# Altium footprint library LimeMicroAltiumLib.PcbLib: 769 footprints (part 49 of 50)
Each footprint in its own frame and in the unit in brackets; x right, y up, seen from the top. Pads: shape width x height; smd on the part's side, far side on the other; paste and mask are expansions set on the pad; w line width, h text height; cw(c..) or ccw(c..) is an arc to the next point about the centre after c.
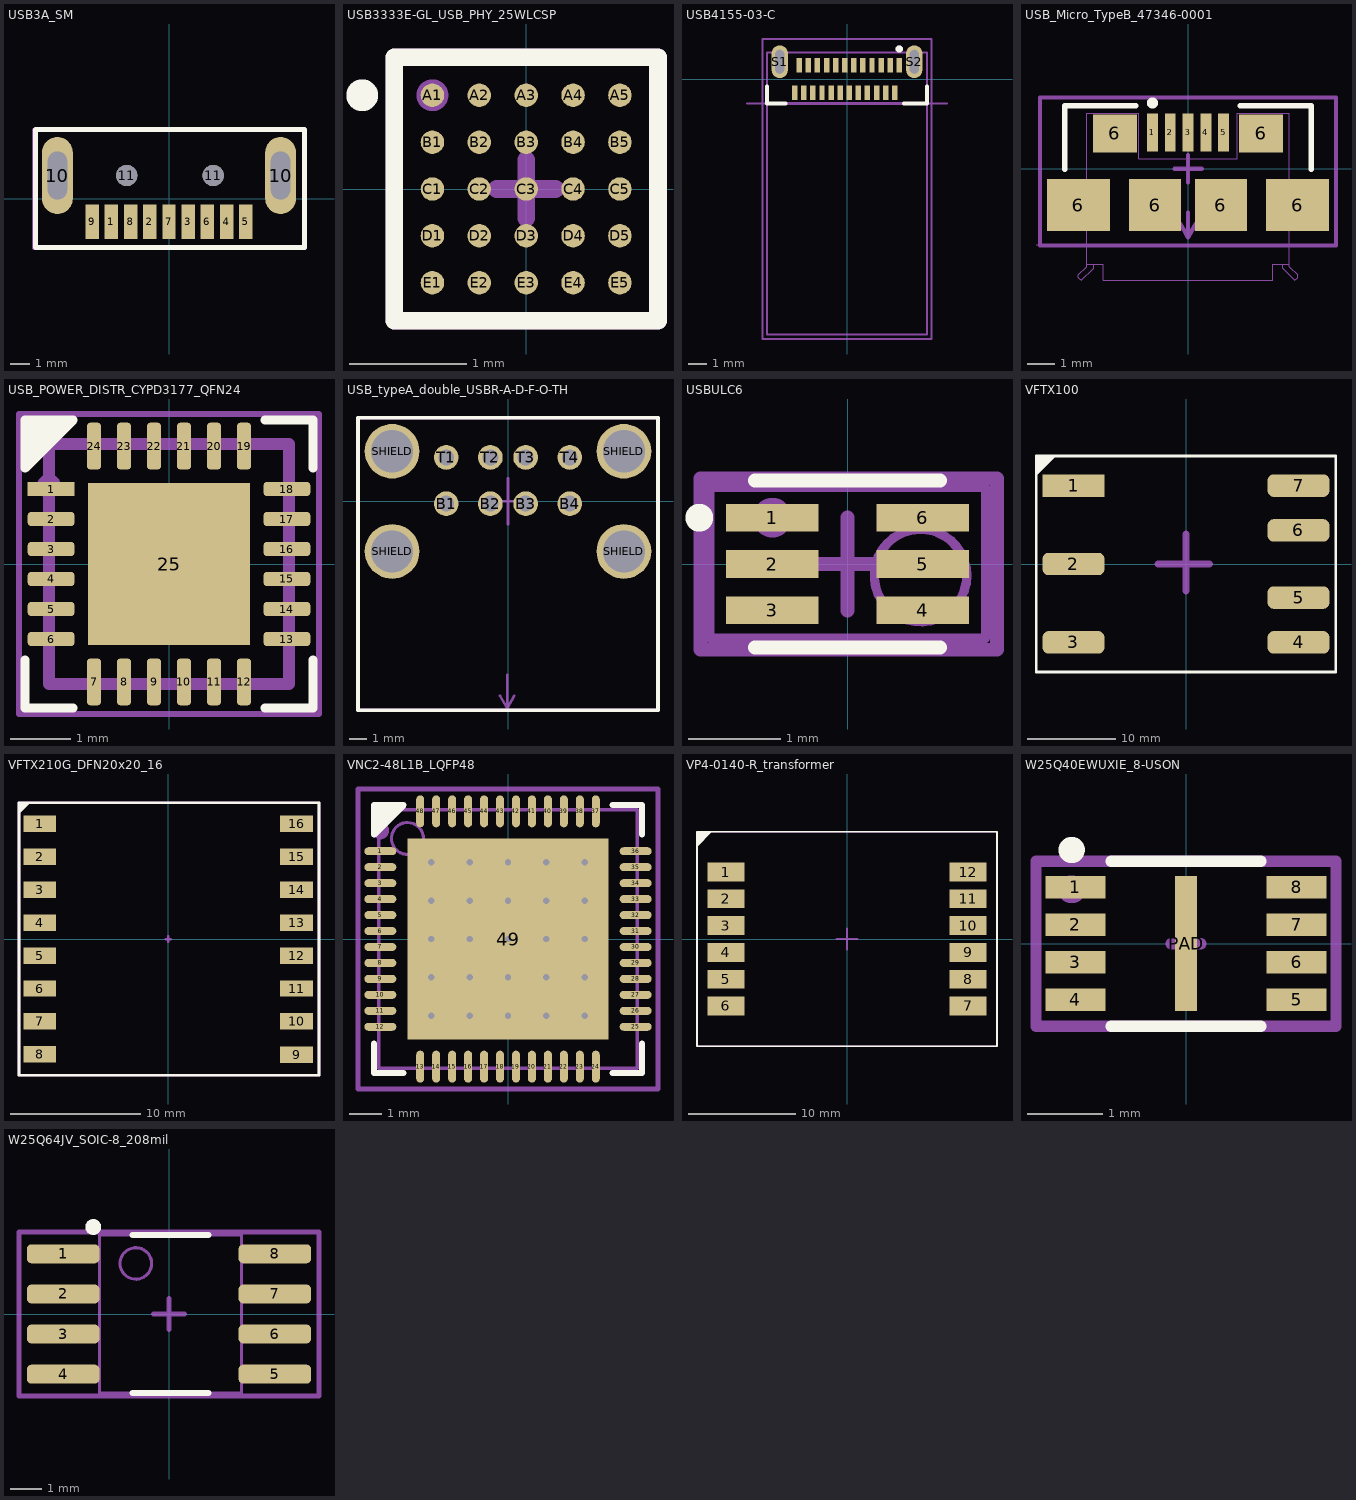
[diagram p48: the footprints below, top view; thin cyan lines are the x and y axes]

## USB3A_SM [mm]
pads (13):
  rect 0.7x1.8 smd: 1(-3,-1.2) 2(-1,-1.2) 3(1,-1.2) 4(3,-1.2) 5(4,-1.2) 6(2,-1.2) 7(0,-1.2) 8(-2,-1.2) 9(-4,-1.2)
  oval 1.6x4 hole 1 slot 2.5 at 90 deg: 10(-5.8,1.2) 10(5.8,1.2)
  round 1.1 hole 1.1 unplated: 11(-2.2,1.2) 11(2.3,1.2)
Top Overlay:
  lines w0.254: -6.95,-2.55 7.05,-2.55 7.05,3.6 -6.95,3.6 -6.95,-2.55
Mechanical 15:
  lines w0.15: -7.05,-2.6 7.1,-2.6 7.1,3.6 -7.05,3.6 -7.05,-2.6
  text ".Designator" at -0.2,0.3 h0.55
3D body "692112030100.stp": height 1.8, standoff -2.7, extent -6,-1.754 6,19

## USB3333E-GL_USB_PHY_25WLCSP [mm]
pads (25):
  round 0.2 smd paste+0 mask+0.05: A1(-0.8,0.8) A2(-0.4,0.8) A3(0,0.8) A4(0.4,0.8) A5(0.8,0.8) B1(-0.8,0.4) B2(-0.4,0.4) B3(0,0.4) B4(0.4,0.4) B5(0.8,0.4) C1(-0.8,0) C2(-0.4,0) C3(0,0) C4(0.4,0) C5(0.8,0) D1(-0.8,-0.4) D2(-0.4,-0.4) D3(0,-0.4) D4(0.4,-0.4) D5(0.8,-0.4) E1(-0.8,-0.8) E2(-0.4,-0.8) E3(0,-0.8) E4(0.4,-0.8) E5(0.8,-0.8)
Top Overlay:
  circle w0.2: c-1.4,0.8 r0.035
  lines w0.15: -1.125,-1.125 1.125,-1.125 1.125,1.125 -1.125,1.125 -1.125,-1.125
Mechanical 15:
  circle w0.2: c-0.8,0.8 r0.035
  lines w0.15: -0.25,0 0,0 ; 0,-0.25 0,0 ; 0,0.25 0,0 ; 0.25,0 0,0 ; -1.125,-1.125 -1.125,1.125 1.125,1.125 1.125,-1.125 -1.125,-1.125
  text ".Designator" at 0,0 h0.55
3D body: height 0.23, standoff -0.03, extent -0.121,-0.125 0.121,0.121
3D body: height 0.23, standoff -0.03, extent -0.121,0.675 0.121,0.921
3D body: height 0.23, standoff -0.03, extent -0.121,0.275 0.121,0.521
3D body: height 0.23, standoff -0.03, extent -0.121,-0.525 0.121,-0.279
3D body: height 0.23, standoff -0.03, extent -0.121,-0.925 0.121,-0.679
3D body: height 0.23, standoff -0.03, extent 0.679,-0.125 0.921,0.121
3D body: height 0.23, standoff -0.03, extent 0.279,-0.125 0.521,0.121
3D body: height 0.23, standoff -0.03, extent -0.521,-0.125 -0.279,0.121
3D body: height 0.23, standoff -0.03, extent -0.921,-0.125 -0.679,0.121
3D body: height 0.23, standoff -0.03, extent 0.279,0.675 0.521,0.921
3D body: height 0.23, standoff -0.03, extent 0.679,0.675 0.921,0.921
3D body: height 0.23, standoff -0.03, extent 0.679,0.275 0.921,0.521
3D body: height 0.23, standoff -0.03, extent 0.279,0.275 0.521,0.521
3D body: height 0.23, standoff -0.03, extent 0.679,-0.525 0.921,-0.279
3D body: height 0.23, standoff -0.03, extent 0.279,-0.525 0.521,-0.279
3D body: height 0.23, standoff -0.03, extent 0.679,-0.925 0.921,-0.679
3D body: height 0.23, standoff -0.03, extent 0.279,-0.925 0.521,-0.679
3D body: height 0.23, standoff -0.03, extent -0.921,0.675 -0.679,0.921
3D body: height 0.23, standoff -0.03, extent -0.521,0.675 -0.279,0.921
3D body: height 0.23, standoff -0.03, extent -0.521,0.275 -0.279,0.521
3D body: height 0.23, standoff -0.03, extent -0.921,0.275 -0.679,0.521
3D body: height 0.23, standoff -0.03, extent -0.521,-0.525 -0.279,-0.279
3D body: height 0.23, standoff -0.03, extent -0.921,-0.525 -0.679,-0.279
3D body: height 0.23, standoff -0.03, extent -0.521,-0.925 -0.279,-0.679
3D body: height 0.23, standoff -0.03, extent -0.921,-0.925 -0.679,-0.679
3D body: height 0.62, standoff 0.16, extent -1.004,-1.002 0.996,0.998

## USB4155-03-C [mm] "USB3 type C connector"
pads (26):
  rect 0.3x0.8 smd mask+0.05: A1(2.875,0.75) A2(2.375,0.75) A3(1.875,0.75) A4(1.375,0.75) A5(0.875,0.75) A6(0.375,0.75) A7(-0.125,0.75) A8(-0.625,0.75) A9(-1.125,0.75) A10(-1.625,0.75) A11(-2.125,0.75) A12(-2.625,0.75) B1(-2.875,-0.75) B2(-2.375,-0.75) B3(-1.875,-0.75) B4(-1.375,-0.75) B5(-0.875,-0.75) B6(-0.375,-0.75) B7(0.125,-0.75) B8(0.625,-0.75) B9(1.125,-0.75) B10(1.625,-0.75) B11(2.125,-0.75) B12(2.625,-0.75)
  oval 0.9x1.8 hole 0.5 slot 1.3 at 90 deg mask+0.05: S1(-3.7,0.95) S2(3.7,0.95)
Top Overlay:
  circle w0.2: c2.875,1.65 r0.1
  lines w0.2: -4.4,-0.4 -4.4,-1.35 -3.375,-1.35 ; 3.125,-1.35 4.4,-1.35 4.4,-0.4
Mechanical 13:
  circle w0.2: c2.875,1.65 r0.1
  lines w0.1: -5.5,-1.35 5.5,-1.35 ; -4.4,-14.05 -4.4,1.45 4.4,1.45 4.4,-14.05 -4.4,-14.05
  text "PCB Edge" at -3.525,-2.5 h0.81
Mechanical 15:
  lines w0.1: -4.65,-14.3 -4.65,2.2 4.65,2.2 4.65,-14.3 -4.65,-14.3
  lines w0.15: -3.725,-1.35 3.725,-1.35
  text "B12" at 2.125,-0.35 h0.4
  text "B1" at -3.175,-0.325 h0.4
  text "A1" at 2.55,1.175 h0.4
  text "A12" at -3.1,1.175 h0.4
  text "PCB Edge" at -1.95,-0.95 h0.55
  text ".Designator" at 0,0 h0.55
3D body "USB4155-03-C--3DModel-STEP-1.STEP": height 1.6, standoff -1.3, extent -4.4,-14.05 4.4,1.45

## USB_Micro_TypeB_47346-0001 [mm]
pads (11):
  rect 0.4x1.4 smd mask+0.074: 1(-1.3,1.325) 2(-0.65,1.325) 3(0,1.325) 4(0.65,1.325) 5(1.3,1.325)
  rect 2.3x1.9 smd: 6(-4,-1.325) 6(4,-1.325)
  rect 1.6x1.4 smd: 6(-2.667,1.289) 6(2.667,1.289)
  rect 1.9x1.9 smd: 6(-1.2,-1.325) 6(1.2,-1.325)
Top Overlay:
  circle w0.2: c-1.3,2.4 r0.1
  lines w0.2: -4.5,-0.025 -4.5,2.305 -1.9,2.305 ; 1.9,2.305 4.5,2.305 4.5,-0.025
Mechanical 13:
  lines w0.02: -5.55,-2.775 5.35,-2.775 ; -3.45,-3.475 -3.45,-3.625 -3.9,-4.075 -4,-3.975 -4,-3.875 -3.7,-3.575 -3.7,-3.475 ; 3.45,-3.475 3.45,-3.625 3.9,-4.075 4,-3.975 4,-3.875 3.7,-3.575 3.7,-3.475 ; -3.7,-3.475 -3.1,-3.475 -3.1,-4.075 0,-4.075 3.1,-4.075 3.1,-3.475 3.7,-3.475 ; -3.7,-3.475 -3.7,2.025 -1.8,2.025 -1.8,0.375 0,0.375 1.8,0.375 1.8,2.025 3.7,2.025 3.7,-3.475
  text "1" at -1.3,0.825 h0.5
  text "5" at 1.1,0.925 h0.5
  text "PCB Edge" at -5.25,-2.725 h0.25
Mechanical 15:
  circle w0.2: c-1.3,1.5 r0.1
  lines w0.15: -0.5,0 0,0 ; -0.289,-1.994 0,-2.5 ; 0,-1.6 0,-2.5 ; 0,-0.5 0,0 ; 0,0.5 0,0 ; 0.289,-1.994 0,-2.5 ; 0.5,0 0,0 ; -5.4,-2.8 -5.4,2.6 5.4,2.6 5.4,-2.8 -5.4,-2.8
  text "PCB edge" at -1.4,-1.4 h0.4
  text ".Designator" at 0,0 h0.55
3D body "Micro USB.step": height 2.7, standoff -0.24, extent -4,-3.715 3.98,1.715

## USB_POWER_DISTR_CYPD3177_QFN24 [mm]
pads (25):
  rect 0.781x0.239 smd paste+0 mask+0.05: 1(-1.966,1.25)
  rrect50% 0.781x0.239 smd paste+0 mask+0.05: 2(-1.966,0.75) 3(-1.966,0.25) 4(-1.966,-0.25) 5(-1.966,-0.75) 6(-1.966,-1.25) 13(1.966,-1.25) 14(1.966,-0.75) 15(1.966,-0.25) 16(1.966,0.25) 17(1.966,0.75) 18(1.966,1.25)
  rrect50% 0.239x0.781 smd paste+0 mask+0.05: 7(-1.25,-1.966) 8(-0.75,-1.966) 9(-0.25,-1.966) 10(0.25,-1.966) 11(0.75,-1.966) 12(1.25,-1.966) 19(1.25,1.966) 20(0.75,1.966) 21(0.25,1.966) 22(-0.25,1.966) 23(-0.75,1.966) 24(-1.25,1.966)
  rect 2.7x2.7 smd mask+0.05: 25(0,0)
Top Overlay:
  region: -2.4,1.6 -1.6,2.4 -2.4,2.4
  lines w0.15: -2.4,-1.6 -2.4,-2.4 -1.6,-2.4 ; 1.6,-2.4 2.4,-2.4 2.4,-1.6 ; 1.6,2.4 2.4,2.4 2.4,1.6 ; -2.4,1.6 -2.4,2.4 -1.6,2.4 -2.4,1.6
Mechanical 13:
  lines w0.2: -2,-2 -2,2 2,2 2,-2 -2,-2
Mechanical 15:
  circle w0.2: c-2,1.3 r0.1
  lines w0.1: -0.5,0 0,0 ; 0,-0.5 0,0 ; 0,0.5 0,0 ; 0.5,0 0,0 ; -2.5,-2.5 -2.5,2.5 2.5,2.5 2.5,-2.5 -2.5,-2.5
  text ".Designator" at 0,0 h0.55
3D body "IC_Cypress_Semiconductor_CYPD3177-24LQXQ_eec.STEP": height 0.25, standoff 0, extent -2.606,-2.606 2.606,2.606

## USB_typeA_double_USBR-A-D-F-O-TH [mm]
pads (12):
  round 1.4 hole 0.9 mask+0.05: B1(-3.5,-0.13) B2(-1,-0.13) B3(1,-0.13) B4(3.5,-0.13) T1(-3.5,2.49) T2(-1,2.49) T3(1,2.49) T4(3.5,2.49)
  round 3.1 hole 2.4 mask+0.05: SHIELD(-6.57,-2.84) SHIELD(-6.57,2.84) SHIELD(6.57,-2.84) SHIELD(6.57,2.84)
Top Overlay:
  lines w0.2: -8.5,-11.85 -8.5,4.75 8.5,4.75 8.5,-11.85 -8.5,-11.85
Mechanical 15:
  lines w0.15: -1.3,0 0,0 ; -0.45,-11.025 -0.05,-11.725 ; -0.05,-9.825 -0.05,-11.725 ; 0,-1.3 0,0 ; 0,1.3 0,0 ; 0.35,-11.025 -0.05,-11.725 ; 1.3,0 0,0
  lines w0.2: -8.5,-11.85 8.5,-11.85 8.5,4.75 -8.5,4.75 -8.5,-11.85
  text "B4" at 3,-0.5 h0.55
  text "B1" at -4,-0.5 h0.55
  text "T4" at 3,2 h0.55
  text "T1" at -4,2 h0.55
  text ".Designator" at -0.1,-0.3 h0.55
  text "PCB edge" at -1.85,-9.925 h0.55
3D body "USBR-A-D-F-O-TH.stp": height 16.1, standoff -4.2, extent -7.798,-13.55 7.798,4.1

## USBULC6 [mm]
height 1.2
pads (6):
  rect 1x0.3 smd mask+0.05: 1(-0.812,0.5) 2(-0.812,0) 3(-0.812,-0.5) 4(0.813,-0.5) 5(0.813,0) 6(0.813,0.5)
Top Overlay:
  circle w0.25: c-1.6,0.5 r0.025
  lines w0.15: -1,-0.9 1,-0.9 ; -1,0.9 1,0.9
Mechanical 13:
  circle w0.1: c0.788,-0.125 r0.5
  lines w0.1: -1.487,-0.8 -1.487,0.825 1.488,0.825 1.488,-0.8 -1.487,-0.8
Mechanical 15:
  circle w0.35: c-0.812,0.5 r0.038
  lines w0.15: -0.5,0 0.5,0 ; 0,-0.5 0,0.5 ; -1.587,-0.925 -1.587,0.925 1.613,0.925 1.613,-0.925 -1.587,-0.925
  text ".Designator" at 0,0 h0.55
3D body: height 1.5, standoff 0, extent -0.825,-0.5 0.825,0.5

## uSpark_BODY1_MECH [mm]
3D body "User Library-SMA Antenna.step": height 81.97, standoff -5, extent 52.5,17.65 83.4,27.65
3D body "User Library-SMA Antenna.step": height 81.97, standoff -5, extent 52.475,3.325 83.375,13.325
3D body "User Library-SMA Antenna.step": height 81.97, standoff -5, extent 52.475,-24.75 83.375,-14.75
3D body "User Library-SMA Antenna.step": height 81.97, standoff -5, extent 52.475,-10.425 83.375,-0.425
3D body "1455A1202.stp": height 4.37, standoff -7.63, extent -73.5,-33.291 52.5,36.711

## uSpark_BODY_MECH [mm]
3D body "User Library-SMA Antenna.step": height 86.97, standoff 0, extent 52.475,-10.425 83.375,-0.425
3D body "User Library-SMA Antenna.step": height 86.97, standoff 0, extent 52.475,-24.75 83.375,-14.75
3D body "User Library-SMA Antenna.step": height 86.97, standoff 0, extent 52.475,3.325 83.375,13.325
3D body "User Library-SMA Antenna.step": height 86.97, standoff 0, extent 52.5,17.65 83.4,27.65
3D body "1455A1002.stp": height 9.37, standoff -2.63, extent -53.525,-34.611 52.475,35.391

## uSpark_BODY_PANEL_MECH [mm]
3D body: height 6, standoff 0, extent 50,-26 51.5,29
3D body "User Library-SMA-2.step": height 8.25, standoff -2.25, extent 23.85,-25.025 58.85,-14.525
3D body "User Library-SMA-2.step": height 8.25, standoff -2.25, extent 23.85,-10.7 58.85,-0.2
3D body "User Library-SMA-2.step": height 8.25, standoff -2.25, extent 23.85,3.05 58.85,13.55
3D body "User Library-SMA-2.step": height 8.25, standoff -2.25, extent 23.875,17.375 58.875,27.875
3D body "User Library-SMA Antenna.step": height 84.97, standoff -2, extent 52.475,-10.425 83.375,-0.425
3D body "User Library-SMA Antenna.step": height 84.97, standoff -2, extent 52.475,-24.75 83.375,-14.75
3D body "User Library-SMA Antenna.step": height 84.97, standoff -2, extent 52.475,3.325 83.375,13.325
3D body "User Library-SMA Antenna.step": height 84.97, standoff -2, extent 52.5,17.65 83.4,27.65

## VFTX100 [mm]
pads (7):
  rect 7x2.54 smd: 1(-12.763,8.89)
  rrect50% 7x2.54 smd: 2(-12.764,0) 3(-12.764,-8.89) 4(12.764,-8.89) 5(12.764,-3.81) 6(12.763,3.81) 7(12.764,8.89)
Top Overlay:
  region: -17,12.25 -14.75,12.25 -17,10
  lines w0.3: -17,-12.25 -17,12.25 17,12.25 17,-12.25 -17,-12.25
Mechanical 15:
  lines w0.2: -17.018,-12.25 -17.018,12.25 17.018,12.25 17.018,-12.25 -17.018,-12.25
  lines w0.8: -3.175,0.025 0,0.025 ; 0,-3.087 0,0 ; 0,3.429 0,0.025 ; 2.667,0.025 0,0.025
  text "7" at 12,8.25 h1
  text "4" at 12,-9.75 h1
  text "3" at -13.5,-9.5 h1
  text "1" at -13.5,7.75 h1
  text ".Designator" at 0,0 h3
3D body: height 6.73, standoff 0, extent -12.827,-11.176 12.827,11.176

## VFTX210G_DFN20x20_16 [mm]
pads (16):
  rect 2.54x1.27 smd: 1(-9.9,8.9) 2(-9.9,6.35) 3(-9.9,3.81) 4(-9.9,1.27) 5(-9.9,-1.27) 6(-9.9,-3.81) 7(-9.9,-6.35) 8(-9.9,-8.89) 9(9.9,-8.9) 10(9.9,-6.35) 11(9.9,-3.81) 12(9.9,-1.27) 13(9.9,1.27) 14(9.9,3.81) 15(9.9,6.35) 16(9.9,8.9)
Top Overlay:
  region: -11.5,9.65 -10.638,10.512 -11.5,10.513
  lines w0.2: -11.5,-10.5 -11.5,10.5 11.625,10.5 11.625,-10.5 -11.5,-10.5
Mechanical 15:
  circle w0.254: c-9.9,8.9 r0.106
  lines w0.2: -0.2,0 0,0 ; 0,-0.2 0,0 ; 0,0.2 0,0 ; 0.2,0 0,0 ; -11.5,-10.5 -11.5,10.5 11.625,10.5 11.625,-10.5 -11.5,-10.5
  text ".Designator" at 0,0 h0.55
  text "1" at 9.8,8.6 h0.55
3D body: height 6.01, standoff 0, extent -8.492,6.502 -6.5,8.498
3D body: height 6, standoff 0, extent -10,-10 10,10

## VNC2-48L1B_LQFP48 [mm] "VNC2-48L1B chip with LQFP-48 package"
pads (49):
  oval 1x0.25 smd mask+0.05: 1(-4,2.75) 2(-4,2.25) 3(-4,1.75) 4(-4,1.25) 5(-4,0.75) 6(-4,0.25) 7(-4,-0.25) 8(-4,-0.75) 9(-4,-1.25) 10(-4,-1.75) 11(-4,-2.25) 12(-4,-2.75) 25(4,-2.75) 26(4,-2.25) 27(4,-1.75) 28(4,-1.25) 29(4,-0.75) 30(4,-0.25) 31(4,0.25) 32(4,0.75) 33(4,1.25) 34(4,1.75) 35(4,2.25) 36(4,2.75)
  oval 0.25x1 smd mask+0.05: 13(-2.75,-4) 14(-2.25,-4) 15(-1.75,-4) 16(-1.25,-4) 17(-0.75,-4) 18(-0.25,-4) 19(0.25,-4) 20(0.75,-4) 21(1.25,-4) 22(1.75,-4) 23(2.25,-4) 24(2.75,-4) 37(2.75,4) 38(2.25,4) 39(1.75,4) 40(1.25,4) 41(0.75,4) 42(0.25,4) 43(-0.25,4) 44(-0.75,4) 45(-1.25,4) 46(-1.75,4) 47(-2.25,4) 48(-2.75,4)
  rect 6.3x6.3 smd: 49(0,0)
via -2.4,2.4 diameter 0.4 hole 0.2
via -1.2,2.4 diameter 0.4 hole 0.2
via 0,2.4 diameter 0.4 hole 0.2
via 1.2,2.4 diameter 0.4 hole 0.2
via 2.4,2.4 diameter 0.4 hole 0.2
via -2.4,1.2 diameter 0.4 hole 0.2
via -1.2,1.2 diameter 0.4 hole 0.2
via 0,1.2 diameter 0.4 hole 0.2
via 1.2,1.2 diameter 0.4 hole 0.2
via 2.4,1.2 diameter 0.4 hole 0.2
via -2.4,0 diameter 0.4 hole 0.2
via -1.2,0 diameter 0.4 hole 0.2
via 0,0 diameter 0.4 hole 0.2
via 1.2,0 diameter 0.4 hole 0.2
via 2.4,0 diameter 0.4 hole 0.2
via -2.4,-1.2 diameter 0.4 hole 0.2
via -1.2,-1.2 diameter 0.4 hole 0.2
via 0,-1.2 diameter 0.4 hole 0.2
via 1.2,-1.2 diameter 0.4 hole 0.2
via 2.4,-1.2 diameter 0.4 hole 0.2
via -2.4,-2.4 diameter 0.4 hole 0.2
via -1.2,-2.4 diameter 0.4 hole 0.2
via 0,-2.4 diameter 0.4 hole 0.2
via 1.2,-2.4 diameter 0.4 hole 0.2
via 2.4,-2.4 diameter 0.4 hole 0.2
Top Overlay:
  region: -4.2,3.2 -3.2,4.2 -4.2,4.2
  lines w0.2: -4.2,-3.275 -4.2,-4.2 -3.275,-4.2 ; 3.275,-4.2 4.2,-4.2 4.2,-3.275 ; 3.275,4.2 4.2,4.2 4.2,3.275 ; -4.2,3.275 -3.275,4.2 -4.2,4.2 -4.2,3.275
Mechanical 13:
  circle w0.1: c-3.15,3.15 r0.5
  lines w0.1: -4.05,-4.05 -4.05,4.05 4.05,4.05 4.05,-4.05 -4.05,-4.05
Mechanical 15:
  circle w0.35: c-4,3.4 r0.1
  lines w0.15: -0.5,0 0.5,0 ; 0,-0.5 0,0.5 ; -4.7,-4.7 -4.7,4.7 4.7,4.7 4.7,-4.7 -4.7,-4.7
  text ".Designator" at 0,0 h0.55
3D body: height 1, standoff 0, extent -4.05,-4.05 4.05,4.05

## VP4-0140-R_transformer [mm]
pads (12):
  rect 3.43x1.75 smd mask+0.05: 1(-11.3,6.25) 2(-11.3,3.75) 3(-11.3,1.25) 4(-11.3,-1.25) 5(-11.3,-3.75) 6(-11.3,-6.25) 7(11.3,-6.25) 8(11.3,-3.75) 9(11.3,-1.25) 10(11.3,1.25) 11(11.3,3.75) 12(11.3,6.25)
Top Overlay:
  region: -14,8.625 -12.625,10 -14,10
  lines w0.15: -14,-10 14,-10 14,10 -14,10 -14,-10
Mechanical 15:
  lines w0.15: -1,0 1,0 ; 0,-1 0,1 ; -14,-10 14,-10 14,10 -14,10 -14,-10
  text ".Designator" at 0,0 h0.55
  text "1" at -11.5,6 h0.55
  text "6" at -11.5,-6.5 h0.55
  text "7" at 11.5,-6.5 h0.55
  text "12" at 11.5,6 h0.55
3D body: height 2, standoff 0, extent 9,5.9 12.3,6.6
3D body: height 2, standoff 0, extent 9,3.4 12.3,4.1
3D body: height 2, standoff 0, extent 9,0.9 12.3,1.6
3D body: height 2, standoff 0, extent 9,-1.6 12.3,-0.9
3D body: height 2, standoff 0, extent 9,-4.1 12.3,-3.4
3D body: height 2, standoff 0, extent 9,-6.6 12.3,-5.9
3D body: height 2, standoff 0, extent -12.3,-6.6 -9,-5.9
3D body: height 2, standoff 0, extent -12.3,-4.1 -9,-3.4
3D body: height 2, standoff 0, extent -12.3,-1.6 -9,-0.9
3D body: height 2, standoff 0, extent -12.3,0.9 -9,1.6
3D body: height 2, standoff 0, extent -12.3,3.4 -9,4.1
3D body: height 2, standoff 0, extent -12.3,5.9 -9,6.6
3D body: height 10, standoff 0, extent -9,-9 9,9

## W25Q40EWUXIE_8-USON [mm]
pads (9):
  rect 0.8x0.3 smd mask+0.05: 1(-1.475,0.75) 2(-1.475,0.25) 3(-1.475,-0.25) 4(-1.475,-0.75) 5(1.475,-0.75) 6(1.475,-0.25) 7(1.475,0.25) 8(1.475,0.75)
  rect 0.3x1.8 smd mask+0.05: PAD(0,0)
Top Overlay:
  circle w0.3: c-1.525,1.25 r0.025
  lines w0.15: -1,-1.1 1,-1.1 ; -1,1.1 1,1.1
Mechanical 15:
  circle w0.3: c-1.525,0.725 r0.035
  lines w0.15: -0.2,0 0.2,0 ; 0,-0.2 0,0.2 ; -2,-1.1 -2,1.1 2,1.1 2,-1.1 -2,-1.1
  text ".Designator" at 0,0 h0.55
3D body "User Library-8MA3.step": height 0.6, standoff 0, extent -1.51,-1 1.51,1

## W25Q64JV_SOIC-8_208mil [mm] "8-Pin Small Outline Integrated Circuit 1.27 mm Pitch"
height 1.55
pads (8):
  rrect50% 2.3x0.6 smd: 1(-3.35,1.905) 2(-3.35,0.635) 3(-3.35,-0.635) 4(-3.35,-1.905) 5(3.35,-1.905) 6(3.35,-0.635) 7(3.35,0.635) 8(3.35,1.905)
Top Overlay:
  circle w0.25: c-2.4,2.755 r0.125
  lines w0.2: -1.15,-2.5 1.25,-2.5 ; -1.15,2.5 1.25,2.5
Mechanical 13:
  circle w0.1: c-1.05,1.6 r0.5
  lines w0.1: -2.2,-2.5 -2.2,2.5 2.3,2.5 2.3,-2.5 -2.2,-2.5
Mechanical 15:
  circle w0.35: c-3.05,1.9 r0.1
  lines w0.15: -0.5,0 0.5,0 ; 0,-0.5 0,0.5 ; -4.75,-2.6 -4.75,2.6 4.75,2.6 4.75,-2.6 -4.75,-2.6
  text ".Designator" at 0,0 h0.55
3D body "User Library-SOIC8_Wide_5mmx5mm.step": height 1.75, standoff -0.01, extent -4.002,-2.73 4.1,2.73